# Altium footprint library HW_HOLLAND_NCDM_MONITOR_R1.PcbLib: 472 footprints (part 12 of 30)
Each footprint in its own frame and in the unit in brackets; x right, y up, seen from the top. Pads: shape width x height; smd on the part's side, far side on the other; paste and mask are expansions set on the pad; w line width, h text height; cw(c..) or ccw(c..) is an arc to the next point about the centre after c.
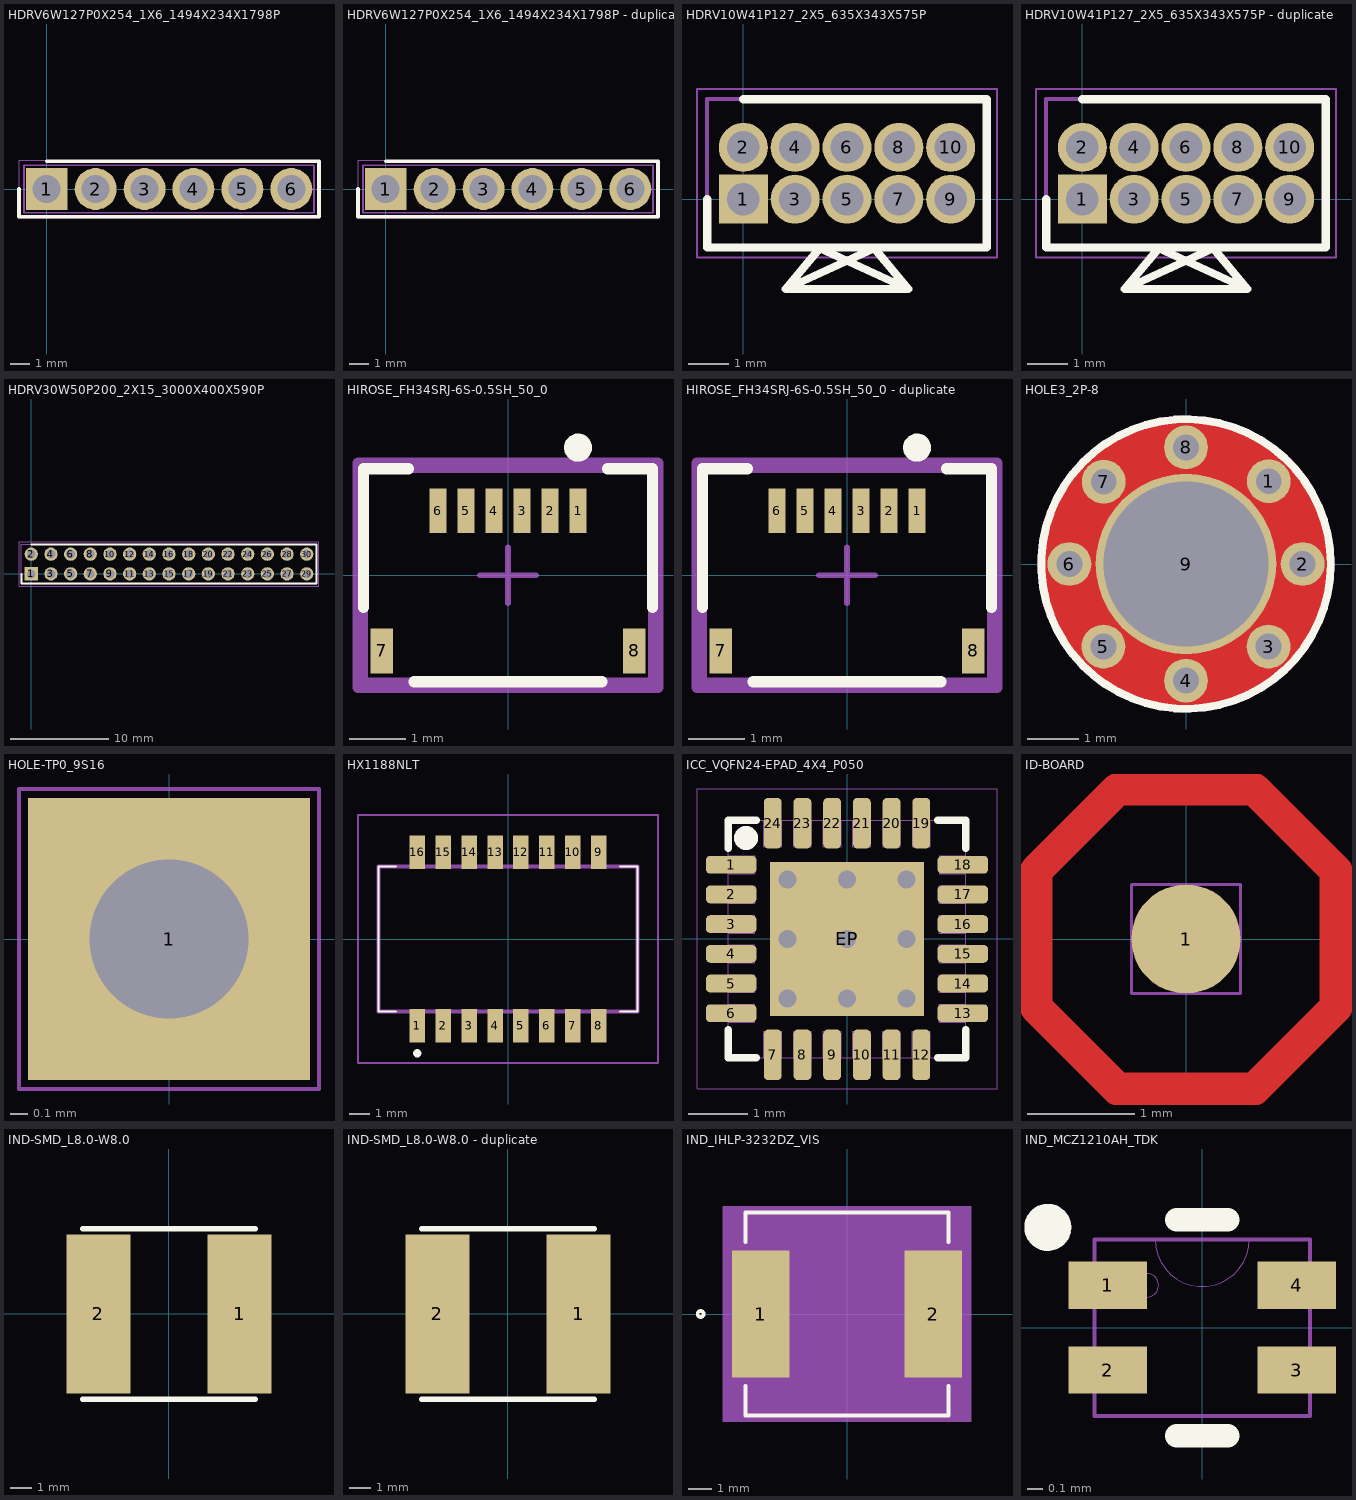
[diagram p11: the footprints below, top view; thin cyan lines are the x and y axes]

## HDRV6W127P0X254_1X6_1494X234X1798P [mm]
pads (6):
  rect 2.175x2.175 / inner round 2.175 / far side rect 2.175x2.175 hole 1.45: 1(0,0)
  round 2.175 hole 1.45: 2(2.54,0) 3(5.08,0) 4(7.62,0) 5(10.16,0) 6(12.7,0)
Top Overlay:
  lines w0.2: -1.438,0 -1.438,-1.438 14.137,-1.438 14.137,1.437 0,1.437
Mechanical 15:
  lines w0.1: -1.184,-1.232 13.883,-1.232 13.883,1.232 -1.184,1.232 -1.184,-1.232
Mechanical 20:
  lines w0.05: -1.434,-1.482 14.133,-1.482 14.133,1.482 -1.434,1.482 -1.434,-1.482

## HDRV6W127P0X254_1X6_1494X234X1798P - duplicate [mm]
pads (6):
  rect 2.175x2.175 / inner round 2.175 / far side rect 2.175x2.175 hole 1.45: 1(0,0)
  round 2.175 hole 1.45: 2(2.54,0) 3(5.08,0) 4(7.62,0) 5(10.16,0) 6(12.7,0)
Top Overlay:
  lines w0.2: -1.438,0 -1.438,-1.438 14.137,-1.438 14.137,1.437 0,1.437
Mechanical 15:
  lines w0.1: -1.184,-1.232 13.883,-1.232 13.883,1.232 -1.184,1.232 -1.184,-1.232
Mechanical 20:
  lines w0.05: -1.434,-1.482 14.133,-1.482 14.133,1.482 -1.434,1.482 -1.434,-1.482

## HDRV10W41P127_2X5_635X343X575P [mm]
pads (10):
  rect 1.2x1.2 hole 0.8: 1(0,0)
  round 1.2 hole 0.8: 2(0,1.27) 3(1.27,0) 4(1.27,1.27) 5(2.54,0) 6(2.54,1.27) 7(3.81,0) 8(3.81,1.27) 9(5.08,0) 10(5.08,1.27)
Top Overlay:
  lines w0.2: -0.885,0 -0.885,-1.18 5.965,-1.18 5.965,2.45 0,2.45 ; 1.04,-2.2 3.205,-1.2 4.04,-2.2 ; 1.04,-2.2 1.875,-1.2 4.04,-2.2 ; 1.04,-2.2 4.04,-2.2
Mechanical 13:
  lines w0.1: -0.885,-1.18 5.965,-1.18 5.965,2.45 -0.885,2.45 -0.885,-1.18
Mechanical 15:
  lines w0.05: -1.135,-1.43 6.215,-1.43 6.215,2.7 -1.135,2.7 -1.135,-1.43
3D body "20021111-00010T4LF.stp": height 5.5, standoff -2.35, extent -0.618,-1.019 5.732,2.381

## HDRV10W41P127_2X5_635X343X575P - duplicate [mm]
pads (10):
  rect 1.2x1.2 hole 0.8: 1(0,0)
  round 1.2 hole 0.8: 2(0,1.27) 3(1.27,0) 4(1.27,1.27) 5(2.54,0) 6(2.54,1.27) 7(3.81,0) 8(3.81,1.27) 9(5.08,0) 10(5.08,1.27)
Top Overlay:
  lines w0.2: -0.885,0 -0.885,-1.18 5.965,-1.18 5.965,2.45 0,2.45 ; 1.04,-2.2 3.205,-1.2 4.04,-2.2 ; 1.04,-2.2 1.875,-1.2 4.04,-2.2 ; 1.04,-2.2 4.04,-2.2
Mechanical 13:
  lines w0.1: -0.885,-1.18 5.965,-1.18 5.965,2.45 -0.885,2.45 -0.885,-1.18
Mechanical 15:
  lines w0.05: -1.135,-1.43 6.215,-1.43 6.215,2.7 -1.135,2.7 -1.135,-1.43
3D body "20021111-00010T4LF.stp": height 5.5, standoff -2.35, extent -0.618,-1.019 5.732,2.381

## HDRV30W50P200_2X15_3000X400X590P [mm]
height 0.52
pads (30):
  rect 1.35x1.35 hole 0.9: 1(0,0)
  round 1.35 hole 0.9: 2(0,2) 3(2,0) 4(2,2) 5(4,0) 6(4,2) 7(6,0) 8(6,2) 9(8,0) 10(8,2) 11(10,0) 12(10,2) 13(12,0) 14(12,2) 15(14,0) 16(14,2) 17(16,0) 18(16,2) 19(18,0) 20(18,2) 21(20,0) 22(20,2) 23(22,0) 24(22,2) 25(24,0) 26(24,2) 27(26,0) 28(26,2) 29(28,0) 30(28,2)
Top Overlay:
  lines w0.2: -1,0 -1,-1 29,-1 29,3 0,3
Mechanical 13:
  lines w0.1: -1,-1 -1,3 29,3 29,-1 -1,-1
Mechanical 15:
  lines w0.05: -1.25,-1.25 -1.25,3.25 29.25,3.25 29.25,-1.25 -1.25,-1.25
3D body "951230-8622-AR.stp": height 5.9, standoff -2.8, extent -1,-1 29,3

## HIROSE_FH34SRJ-6S-0.5SH_50_0 [mm]
pads (8):
  rect 0.3x0.8 smd paste-1000 mask+0: 1(1.25,1.15) 2(0.75,1.15) 3(0.25,1.15) 4(-0.25,1.15) 5(-0.75,1.15) 6(-1.25,1.15)
  rect 0.4x0.8 smd paste+0 mask+0: 7(-2.25,-1.35) 8(2.25,-1.35)
Top Overlay:
  circle w0.25: c1.25,2.275 r0.125
  lines w0.2: -2.575,-0.575 -2.575,1.9 -1.775,1.9 ; -1.675,-1.9 1.675,-1.9 ; 1.775,1.9 2.575,1.9 2.575,-0.575
Top Paste:
  rectangle: 1.125,0.9 1.375,1.55
  rectangle: 0.625,0.9 0.875,1.55
  rectangle: 0.125,0.9 0.375,1.55
  rectangle: -0.375,0.9 -0.125,1.55
  rectangle: -0.875,0.9 -0.625,1.55
  rectangle: -1.375,0.9 -1.125,1.55
Top Courtyard:
  lines w0.2: -2.675,-2 -2.675,2 2.675,2 2.675,-2 -2.675,-2
  text ".Designator" at 0,0 h1
Mechanical 12:
  lines w0.15: -2.575,-1.9 -2.575,1.9 2.575,1.9 2.575,-1.9 -2.575,-1.9
Mechanical 15:
  lines w0.1: -0.5,0 0.5,0 ; 0,-0.5 0,0.5
  lines w0.2: -2.675,-2 -2.675,2 2.675,2 2.675,-2 -2.675,-2
3D body "WFH-2100190.stp": height 1.77, standoff 0, extent -2.5,-1.9 2.5,1.35

## HIROSE_FH34SRJ-6S-0.5SH_50_0 - duplicate [mm]
pads (8):
  rect 0.3x0.8 smd paste-1000 mask+0: 1(1.25,1.15) 2(0.75,1.15) 3(0.25,1.15) 4(-0.25,1.15) 5(-0.75,1.15) 6(-1.25,1.15)
  rect 0.4x0.8 smd paste+0 mask+0: 7(-2.25,-1.35) 8(2.25,-1.35)
Top Overlay:
  circle w0.25: c1.25,2.275 r0.125
  lines w0.2: -2.575,-0.575 -2.575,1.9 -1.775,1.9 ; -1.675,-1.9 1.675,-1.9 ; 1.775,1.9 2.575,1.9 2.575,-0.575
Top Paste:
  rectangle: 1.125,0.9 1.375,1.55
  rectangle: 0.625,0.9 0.875,1.55
  rectangle: 0.125,0.9 0.375,1.55
  rectangle: -0.375,0.9 -0.125,1.55
  rectangle: -0.875,0.9 -0.625,1.55
  rectangle: -1.375,0.9 -1.125,1.55
Top Courtyard:
  lines w0.2: -2.675,-2 -2.675,2 2.675,2 2.675,-2 -2.675,-2
  text ".Designator" at 0,0 h1
Mechanical 12:
  lines w0.15: -2.575,-1.9 -2.575,1.9 2.575,1.9 2.575,-1.9 -2.575,-1.9
Mechanical 15:
  lines w0.1: -0.5,0 0.5,0 ; 0,-0.5 0,0.5
  lines w0.2: -2.675,-2 -2.675,2 2.675,2 2.675,-2 -2.675,-2
3D body "WFH-2100190.stp": height 1.77, standoff 0, extent -2.5,-1.9 2.5,1.35

## HOLE3_2P-8 [mil]
pads (9):
  round 33.46 hole 19.69: 1(63.2,63.2) 2(89,0) 3(63,-63) 4(0,-89) 5(-63,-63) 6(-89,0) 7(-62.8,62.8) 8(0,89)
  round 137.8 hole 125.98: 9(0,0)
Top Layer:
  pour cut-out: 64.34,0 63.1,12.55 59.44,24.62 53.5,35.75 45.5,45.5 35.75,53.5 24.62,59.44 12.55,63.1 0,64.34 -12.55,63.1 -24.62,59.44 -32.03,55.48 -35.75,53.5 -45.5,45.5 -53.5,35.75 -59.44,24.62 -63.1,12.55 -64.34,0 -63.1,-12.55 -59.44,-24.62 -53.5,-35.75 -45.5,-45.5 -35.75,-53.5 -32.03,-55.48 -24.62,-59.44 -12.55,-63.1 0,-64.34 12.55,-63.1 24.62,-59.44 35.75,-53.5 45.5,-45.5 53.5,-35.75 59.44,-24.62 63.1,-12.55
  region: 112.75,0 111.36,17.64 107.23,34.84 100.46,51.19 91.21,66.27 79.72,79.72 66.27,91.21 51.19,100.46 34.84,107.23 17.64,111.36 0,112.75 -17.64,111.36 -34.84,107.23 -51.19,100.46 -56.22,97.37 -66.27,91.21 -79.72,79.72 -91.21,66.27 -100.46,51.19 -107.23,34.84 -111.36,17.64 -112.75,0 -111.36,-17.64 -107.23,-34.84 -100.46,-51.19 -91.21,-66.27 -79.72,-79.72 -66.27,-91.21 -56.22,-97.37 -51.19,-100.46 -34.84,-107.23 -17.64,-111.36 0,-112.75 17.64,-111.36 34.84,-107.23 51.19,-100.46 66.27,-91.21 79.72,-79.72 91.21,-66.27 100.46,-51.19 107.23,-34.84 111.36,-17.64
Bottom Layer:
  pour cut-out: 64.34,0 63.1,12.55 59.44,24.62 53.5,35.75 45.5,45.5 35.75,53.5 24.62,59.44 12.55,63.1 0,64.34 -12.55,63.1 -24.62,59.44 -32.03,55.48 -35.75,53.5 -45.5,45.5 -53.5,35.75 -59.44,24.62 -63.1,12.55 -64.34,0 -63.1,-12.55 -59.44,-24.62 -53.5,-35.75 -45.5,-45.5 -35.75,-53.5 -32.03,-55.48 -24.62,-59.44 -12.55,-63.1 0,-64.34 12.55,-63.1 24.62,-59.44 35.75,-53.5 45.5,-45.5 53.5,-35.75 59.44,-24.62 63.1,-12.55
  region: 112.75,0 111.36,17.64 107.23,34.84 100.46,51.19 91.21,66.27 79.72,79.72 66.27,91.21 51.19,100.46 34.84,107.23 17.64,111.36 0,112.75 -17.64,111.36 -34.84,107.23 -51.19,100.46 -56.22,97.37 -66.27,91.21 -79.72,79.72 -91.21,66.27 -100.46,51.19 -107.23,34.84 -111.36,17.64 -112.75,0 -111.36,-17.64 -107.23,-34.84 -100.46,-51.19 -91.21,-66.27 -79.72,-79.72 -66.27,-91.21 -56.22,-97.37 -51.19,-100.46 -34.84,-107.23 -17.64,-111.36 0,-112.75 17.64,-111.36 34.84,-107.23 51.19,-100.46 66.27,-91.21 79.72,-79.72 91.21,-66.27 100.46,-51.19 107.23,-34.84 111.36,-17.64
Top Overlay:
  circle w6: c0,0 r110.5
Top Solder:
  dashed: 114.48,0 113.07,17.91 108.88,35.38 102,51.97 92.62,67.29 80.95,80.95 67.29,92.62 51.97,102 35.38,108.88 17.91,113.07 0,114.48 -17.91,113.07 -35.38,108.88 -51.97,102 -57.08,98.87 -67.29,92.62 -80.95,80.95 -92.62,67.29 -102,51.97 -108.88,35.38 -113.07,17.91 -114.48,0 -113.07,-17.91 -108.88,-35.38 -102,-51.97 -92.62,-67.29 -80.95,-80.95 -67.29,-92.62 -57.08,-98.87 -51.97,-102 -35.38,-108.88 -17.91,-113.07 0,-114.48 17.91,-113.07 35.38,-108.88 51.97,-102 67.29,-92.62 80.95,-80.95 92.62,-67.29 102,-51.97 108.88,-35.38 113.07,-17.91
Bottom Solder:
  dashed: 114.48,0 113.07,17.91 108.88,35.38 102,51.97 92.62,67.29 80.95,80.95 67.29,92.62 51.97,102 35.38,108.88 17.91,113.07 0,114.48 -17.91,113.07 -35.38,108.88 -51.97,102 -57.08,98.87 -67.29,92.62 -80.95,80.95 -92.62,67.29 -102,51.97 -108.88,35.38 -113.07,17.91 -114.48,0 -113.07,-17.91 -108.88,-35.38 -102,-51.97 -92.62,-67.29 -80.95,-80.95 -67.29,-92.62 -57.08,-98.87 -51.97,-102 -35.38,-108.88 -17.91,-113.07 0,-114.48 17.91,-113.07 35.38,-108.88 51.97,-102 67.29,-92.62 80.95,-80.95 92.62,-67.29 102,-51.97 108.88,-35.38 113.07,-17.91
Top Assembly:
  text ".Designator" at -50.02,-8.34 h25
Top 3D Body:
  region: 111.34,0 109.97,17.42 105.89,34.41 99.21,50.55 90.08,65.45 78.73,78.73 65.45,90.08 50.55,99.21 34.41,105.89 17.42,109.97 0,111.34 -17.42,109.97 -34.41,105.89 -50.55,99.21 -55.52,96.16 -65.45,90.08 -78.73,78.73 -90.08,65.45 -99.21,50.55 -105.89,34.41 -109.97,17.42 -111.34,0 -109.97,-17.42 -105.89,-34.41 -99.21,-50.55 -90.08,-65.45 -78.73,-78.73 -65.45,-90.08 -55.52,-96.16 -50.55,-99.21 -34.41,-105.89 -17.42,-109.97 0,-111.34 17.42,-109.97 34.41,-105.89 50.55,-99.21 65.45,-90.08 78.73,-78.73 90.08,-65.45 99.21,-50.55 105.89,-34.41 109.97,-17.42
Bottom 3D Body:
  region: 113.45,0 112.05,17.75 107.9,35.06 101.08,51.51 91.78,66.68 80.22,80.22 66.68,91.78 51.51,101.08 35.06,107.9 17.75,112.05 0,113.45 -17.75,112.05 -35.06,107.9 -51.51,101.08 -56.57,97.98 -66.68,91.78 -80.22,80.22 -91.78,66.68 -101.08,51.51 -107.9,35.06 -112.05,17.75 -113.45,0 -112.05,-17.75 -107.9,-35.06 -101.08,-51.51 -91.78,-66.68 -80.22,-80.22 -66.68,-91.78 -56.57,-97.98 -51.51,-101.08 -35.06,-107.9 -17.75,-112.05 0,-113.45 17.75,-112.05 35.06,-107.9 51.51,-101.08 66.68,-91.78 80.22,-80.22 91.78,-66.68 101.08,-51.51 107.9,-35.06 112.05,-17.75
Top Component Center:
  dashed: 110.04,0 108.68,17.21 104.65,34 98.05,49.96 89.02,64.68 77.81,77.81 64.68,89.02 49.96,98.05 34,104.65 17.21,108.68 0,110.04 -17.21,108.68 -34,104.65 -49.96,98.05 -54.87,95.04 -64.68,89.02 -77.81,77.81 -89.02,64.68 -98.05,49.96 -104.65,34 -108.68,17.21 -110.04,0 -108.68,-17.21 -104.65,-34 -98.05,-49.96 -89.02,-64.68 -77.81,-77.81 -64.68,-89.02 -54.87,-95.04 -49.96,-98.05 -34,-104.65 -17.21,-108.68 0,-110.04 17.21,-108.68 34,-104.65 49.96,-98.05 64.68,-89.02 77.81,-77.81 89.02,-64.68 98.05,-49.96 104.65,-34 108.68,-17.21
Mechanical 17:
  text "9" at -28,0 h35
  text "5" at -91,-63 h35
  text "4" at -28,-89 h35
  text "3" at 35,-63 h35
  text "7" at -90.8,62.8 h35
  text "6" at -117,0 h35
  text "8" at -28,89 h35
  text "2" at 61,0 h35
  text "1" at 35.2,63.2 h35
3D body: height 150, standoff 0, extent -111.34,-111.34 111.34,111.34
3D body: height 150, standoff 0, extent -113.45,-113.45 113.45,113.45

## HOLE-TP0_9S16 [mm]
pads (1):
  rect 1.6x1.6 / inner round 1.6 / far side rect 1.6x1.6 hole 0.9: 1(0,0)
Top Assembly:
  text ".Designator" at -1.27,-0.212 h0.64
Top 3D Body:
  lines w0.025: -0.85,-0.85 -0.85,0.85 0.85,0.85 0.85,-0.85 -0.85,-0.85
Mechanical 17:
  text "1" at -0.254,0 h0.64

## HX1188NLT [mm]
pads (16):
  rect 0.76x1.65 smd: 1(-4.445,-4.255) 2(-3.175,-4.255) 3(-1.905,-4.255) 4(-0.635,-4.255) 5(0.635,-4.255) 6(1.905,-4.255) 7(3.175,-4.255) 8(4.445,-4.255) 9(4.445,4.255) 10(3.175,4.255) 11(1.905,4.255) 12(0.635,4.255) 13(-0.635,4.255) 14(-1.905,4.255) 15(-3.175,4.255) 16(-4.445,4.255)
Top Overlay:
  lines w0.1: -5.5,-3.555 -6.35,-3.555 -6.35,3.555 -5.5,3.555 ; 5.5,-3.555 6.35,-3.555 6.35,3.555 5.5,3.555
  lines w0.2: -4.445,-5.7 ccw(c-4.445,-5.6) -4.445,-5.5 ccw(c-4.445,-5.6) -4.445,-5.7
Mechanical 15:
  lines w0.2: -6.35,-3.555 -6.35,3.555 6.35,3.555 6.35,-3.555 -6.35,-3.555
Mechanical 20:
  lines w0.1: -7.35,-6.08 -7.35,6.08 7.35,6.08 7.35,-6.08 -7.35,-6.08
3D body "HX1188NLT.stp": height 5.8, standoff -4.65, extent -10,-3.376 10,3.376

## ICC_VQFN24-EPAD_4X4_P050 [mm]
pads (25):
  rrect50% 0.85x0.3 smd mask+0.05: 1(-1.95,1.25) 2(-1.95,0.75) 3(-1.95,0.25) 4(-1.95,-0.25) 5(-1.95,-0.75) 6(-1.95,-1.25) 13(1.95,-1.25) 14(1.95,-0.75) 15(1.95,-0.25) 16(1.95,0.25) 17(1.95,0.75) 18(1.95,1.25)
  rrect50% 0.3x0.85 smd mask+0.05: 7(-1.25,-1.95) 8(-0.75,-1.95) 9(-0.25,-1.95) 10(0.25,-1.95) 11(0.75,-1.95) 12(1.25,-1.95) 19(1.25,1.95) 20(0.75,1.95) 21(0.25,1.95) 22(-0.25,1.95) 23(-0.75,1.95) 24(-1.25,1.95)
  rect 2.6x2.6 smd paste-10 mask+0.05: EP(0,0)
via 0,0 diameter 0.6 hole 0.3
via -1,0 diameter 0.6 hole 0.3
via -1,1 diameter 0.6 hole 0.3
via 0,1 diameter 0.6 hole 0.3
via 1,1 diameter 0.6 hole 0.3
via 1,0 diameter 0.6 hole 0.3
via 1,-1 diameter 0.6 hole 0.3
via 0,-1 diameter 0.6 hole 0.3
via -1,-1 diameter 0.6 hole 0.3
Top Overlay:
  circle w0.254: c-1.7,1.7 r0.075
  lines w0.12: -2,-1.525 -2,-2 -1.525,-2 ; -2,1.525 -2,2 -1.525,2 ; 1.525,-2 2,-2 2,-1.525 ; 1.525,2 2,2 2,1.525
Top Paste:
  rectangle: -0.875,-0.875 -0.125,-0.125
  rectangle: 0.125,-0.875 0.875,-0.125
  rectangle: 0.125,0.125 0.875,0.875
  rectangle: -0.875,0.125 -0.125,0.875
Top Component Outline:
  lines w0.01: -2,-1.4 -1.55,-1.4 -1.55,-1.1 -2,-1.1 ; -2,-0.9 -1.55,-0.9 -1.55,-0.6 -2,-0.6 ; -2,-0.4 -1.55,-0.4 -1.55,-0.1 -2,-0.1 ; -2,0.1 -1.55,0.1 -1.55,0.4 -2,0.4 ; -2,0.6 -1.55,0.6 -1.55,0.9 -2,0.9 ; -2,1.1 -1.55,1.1 -1.55,1.4 -2,1.4 ; -1.4,-2 -1.4,-1.55 -1.1,-1.55 -1.1,-2 ; -1.4,2 -1.4,1.55 -1.1,1.55 -1.1,2 ; -0.9,-2 -0.9,-1.55 -0.6,-1.55 -0.6,-2 ; -0.9,2 -0.9,1.55 -0.6,1.55 -0.6,2 ; -0.4,-2 -0.4,-1.55 -0.1,-1.55 -0.1,-2 ; -0.4,2 -0.4,1.55 -0.1,1.55 -0.1,2 ; 0.1,-2 0.1,-1.55 0.4,-1.55 0.4,-2 ; 0.1,2 0.1,1.55 0.4,1.55 0.4,2 ; 0.6,-2 0.6,-1.55 0.9,-1.55 0.9,-2 ; 0.6,2 0.6,1.55 0.9,1.55 0.9,2 ; 1.1,-2 1.1,-1.55 1.4,-1.55 1.4,-2 ; 1.1,2 1.1,1.55 1.4,1.55 1.4,2 ; 2,-1.4 1.55,-1.4 1.55,-1.1 2,-1.1 ; 2,-0.9 1.55,-0.9 1.55,-0.6 2,-0.6 ; 2,-0.4 1.55,-0.4 1.55,-0.1 2,-0.1 ; 2,0.1 1.55,0.1 1.55,0.4 2,0.4 ; 2,0.6 1.55,0.6 1.55,0.9 2,0.9 ; 2,1.1 1.55,1.1 1.55,1.4 2,1.4 ; -2,-2 -2,2 2,2 2,-2 -2,-2 ; -1.25,-1.25 1.25,-1.25 1.25,1.25 -1.25,1.25 -1.25,-1.25
  text "6" at -2.45,-1.125 h1.25
  text "24" at -1.575,2.05 h1.25
  text "19" at 0.975,2.05 h1.25
  text "18" at 2.45,0.975 h1.25
  text "13" at 2.45,-1.525 h1.25
  text "12" at 0.975,-2.45 h1.25
  text "7" at -1.4,-2.45 h1.25
  text "1" at -2.475,1.325 h1.25
  text "25" at -0.3,-0.225 h1.25
  text "'.Designator'" at -2,0.25 h1.25
Bottom Component Outline:
  lines w0.01: -2.525,-2.525 2.525,-2.525 2.525,2.525 -2.525,2.525 -2.525,-2.525
3D body "VQFN24-EPAD.STEP": height 1.05, standoff -0.03, extent -2.05,-2.05 2.05,2.05
3D body: height 1.1, standoff 1, extent -1.448,1.051 -1.05,1.45
3D body: height 1, standoff 0, extent -2,-2 2,2

## ID-BOARD [mil]
pads (1):
  round 40 smd: 1(0,0)
Top Layer:
  lines w12: -55,-25 -55,25 -25,55 25,55 55,25 55,-25 25,-55 -25,-55 -55,-25
Top 3D Body:
  lines w1: -20,-20 20,-20 20,20 -20,20 -20,-20
Mechanical 17:
  text "1" at -19.2,0 h48

## IND-SMD_L8.0-W8.0 [mm]
pads (2):
  rect 3.024x7.5 smd: 1(3.328,0) 2(-3.328,0)
Top Overlay:
  lines w0.254: -4.076,-4.018 4.076,-4.018 ; -4.076,4.018 4.076,4.018
3D body "SRN8040-101M.SLDPRT": height 4, standoff -0.01, extent -4,-4 4,4

## IND-SMD_L8.0-W8.0 - duplicate [mm]
pads (2):
  rect 3.024x7.5 smd: 1(3.328,0) 2(-3.328,0)
Top Overlay:
  lines w0.254: -4.076,-4.018 4.076,-4.018 ; -4.076,4.018 4.076,4.018
3D body "SRN8040-101M.SLDPRT": height 4, standoff -0.01, extent -4,-4 4,4

## IND_IHLP-3232DZ_VIS [mil]
height 20.47
pads (2):
  rect 95x210 smd paste-47.5 mask+0: 1(-142.5,0) 2(142.5,0)
Top Overlay:
  circle w6: c-241.5,0 r5
  lines w6: -167.5,-118.1 -167.5,-167.5 167.5,-167.5 167.5,-118.1 ; -167.5,118.1 -167.5,167.5 167.5,167.5 167.5,118.1
Bottom 3D Body:
  region: 205,-177.5 -205,-177.5 -205,177.5 205,177.5
Mechanical 13:
  circle w0: c-95,0 r3
  lines w0: -12,162.5 ccw(c0,162.5) 12,162.5
  lines w1: -162.5,-162.5 -162.5,162.5 162.5,162.5 162.5,-162.5 -162.5,-162.5
Mechanical 15:
  region: -172.5,-115 -200,-115 -200,115 -172.5,115 -172.5,172.5 172.5,172.5 172.5,115 200,115 200,-115 172.5,-115 172.5,-172.5 -172.5,-172.5
  lines w6: -200,-115 -172.5,-115 -172.5,-172.5 172.5,-172.5 172.5,-115 200,-115 200,115 172.5,115 172.5,172.5 -172.5,172.5 -172.5,115 -200,115 -200,-115
3D body "IND_IHLP-3232DZ_VIS.step": height 158.11, standoff 0, extent -162.48,-162.48 162.48,162.48

## IND_MCZ1210AH_TDK [mil]
pads (4):
  rect 20x12 smd paste-6 mask+0: 1(-24.11,10.83) 2(-24.11,-10.83) 3(24.11,-10.83) 4(24.11,10.83)
Top Overlay:
  circle w6: c-39.37,25.59 r3
  lines w6: -6.52,-27.5 6.52,-27.5 ; -6.52,27.5 6.52,27.5
Mechanical 13:
  circle w0: c-14.11,10.83 r3
  lines w0: -12,22.5 ccw(c0,22.5) 12,22.5
  lines w1: -27.5,-22.5 -27.5,22.5 27.5,22.5 27.5,-22.5 -27.5,-22.5
3D body "IND_MCZ1210AH_TDK.step": height 24.09, standoff 0, extent -27.48,-22.52 27.48,22.52